# Altium integrated library SpaceVNX.IntLib: 113 symbols (part 1 of 3) (continued)
## ERJ2RKF1623X
designator R?, comment 162 kΩ
General Purpose Thick Film Chip Resistors; Manufacturer: Panasonic; Power (0402): 0.1 W; Limiting Voltage (0402): 50; Maximum Voltage (0402): 100; Resistance Range (Ω): 1Ω to 100MΩ; AEC 200: Grade 0; Size (0402): 2GE; ComponentLink1Description: Catalog; ComponentLink1URL: https://industrial.panasonic.com/ww/products/pt/general-purpose-chip-resistors/models?op=search&model_status_current=1&page=0#model-list-search-results; Series: ERJ; Temperature Range (ºC): -55 to +155; Supplier 1: Mouser; Supplier Part Number 1: 667-ERJ-2RKF1623X
footprint PANASONIC_ERJ2G_0402 (Chip Resistor, 2-Leads, Body 1,00x0,50mm, IPC Medium Density)
pins: 1, 2

## ERJ2RKF1802X
designator R?, comment 18 kΩ
General Purpose Thick Film Chip Resistors; Manufacturer: Panasonic; Power (0402): 0.1 W; Limiting Voltage (0402): 50; Maximum Voltage (0402): 100; Resistance Range (Ω): 1Ω to 100MΩ; AEC 200: Grade 0; Size (0402): 2GE; ComponentLink1Description: Catalog; ComponentLink1URL: https://industrial.panasonic.com/ww/products/pt/general-purpose-chip-resistors/models?op=search&model_status_current=1&page=0#model-list-search-results; Series: ERJ; Temperature Range (ºC): -55 to +155; Supplier 1: Digi-Key; Supplier 2: Mouser; Supplier Part Number 1: P18.0KLCT-ND; Supplier Part Number 2: 667-ERJ-2RKF1802X
footprint PANASONIC_ERJ2G_0402 (Chip Resistor, 2-Leads, Body 1,00x0,50mm, IPC Medium Density)
pins: 1, 2

## ERJ2RKF1822X
designator R?, comment 18.2 kΩ
General Purpose Thick Film Chip Resistors; Manufacturer: Panasonic; Power (0402): 0.1 W; Limiting Voltage (0402): 50; Maximum Voltage (0402): 100; Resistance Range (Ω): 1Ω to 100MΩ; AEC 200: Grade 0; Size (0402): 2GE; ComponentLink1Description: Catalog; ComponentLink1URL: https://industrial.panasonic.com/ww/products/pt/general-purpose-chip-resistors/models?op=search&model_status_current=1&page=0#model-list-search-results; Series: ERJ; Temperature Range (ºC): -55 to +155; Supplier 1: Mouser; Supplier Part Number 1: 667-ERJ-2RKF1822X
footprint PANASONIC_ERJ2G_0402 (Chip Resistor, 2-Leads, Body 1,00x0,50mm, IPC Medium Density)
pins: 1, 2

## ERJ2RKF2002X
designator R?, comment 20 kΩ
General Purpose Thick Film Chip Resistors; Manufacturer: Panasonic; Power (0402): 0.1 W; Limiting Voltage (0402): 50; Maximum Voltage (0402): 100; Resistance Range (Ω): 1Ω to 100MΩ; AEC 200: Grade 0; Size (0402): 2GE; ComponentLink1Description: Catalog; ComponentLink1URL: https://industrial.panasonic.com/ww/products/pt/general-purpose-chip-resistors/models?op=search&model_status_current=1&page=0#model-list-search-results; Series: ERJ; Temperature Range (ºC): -55 to +155; Supplier 1: Digi-Key; Supplier Part Number 1: P20.0KLCT-ND
footprint PANASONIC_ERJ2G_0402 (Chip Resistor, 2-Leads, Body 1,00x0,50mm, IPC Medium Density)
pins: 1, 2

## ERJ2RKF2003X
designator R?, comment 200 kΩ
General Purpose Thick Film Chip Resistors; Manufacturer: Panasonic; Power (0402): 0.1 W; Limiting Voltage (0402): 50; Maximum Voltage (0402): 100; Resistance Range (Ω): 1Ω to 100MΩ; AEC 200: Grade 0; Size (0402): 2GE; ComponentLink1Description: Catalog; ComponentLink1URL: https://industrial.panasonic.com/ww/products/pt/general-purpose-chip-resistors/models?op=search&model_status_current=1&page=0#model-list-search-results; Series: ERJ; Temperature Range (ºC): -55 to +155; Supplier 1: Digi-Key; Supplier Part Number 1: P200KLCT-ND
footprint PANASONIC_ERJ2G_0402 (Chip Resistor, 2-Leads, Body 1,00x0,50mm, IPC Medium Density)
pins: 1, 2

## ERJ2RKF2202X
designator R?, comment 22 kΩ
General Purpose Thick Film Chip Resistors; Manufacturer: Panasonic; Power (0402): 0.1 W; Limiting Voltage (0402): 50; Maximum Voltage (0402): 100; Resistance Range (Ω): 1Ω to 100MΩ; AEC 200: Grade 0; Size (0402): 2GE; ComponentLink1Description: Catalog; ComponentLink1URL: https://industrial.panasonic.com/ww/products/pt/general-purpose-chip-resistors/models?op=search&model_status_current=1&page=0#model-list-search-results; Series: ERJ; Temperature Range (ºC): -55 to +155; Supplier 1: Digi-Key; Supplier 2: Digi-Key; Supplier Part Number 2: P22.0KLDKR-ND; Supplier Part Number 1: P22.0KLCT-ND
footprint PANASONIC_ERJ2G_0402 (Chip Resistor, 2-Leads, Body 1,00x0,50mm, IPC Medium Density)
pins: 1, 2

## ERJ2RKF2672X
designator R?, comment 26.7 kΩ
General Purpose Thick Film Chip Resistors; Manufacturer: Panasonic; Power (0402): 0.1 W; Limiting Voltage (0402): 50; Maximum Voltage (0402): 100; Resistance Range (Ω): 1Ω to 100MΩ; AEC 200: Grade 0; Size (0402): 2GE; ComponentLink1Description: Catalog; ComponentLink1URL: https://industrial.panasonic.com/ww/products/pt/general-purpose-chip-resistors/models?op=search&model_status_current=1&page=0#model-list-search-results; Series: ERJ; Temperature Range (ºC): -55 to +155; Supplier 1: Digi-Key; Supplier Part Number 1: P26.7KLCT-ND
footprint PANASONIC_ERJ2G_0402 (Chip Resistor, 2-Leads, Body 1,00x0,50mm, IPC Medium Density)
pins: 1, 2

## ERJ2RKF3002X
designator R?, comment 30 kΩ
General Purpose Thick Film Chip Resistors; Manufacturer: Panasonic; Power (0402): 0.1 W; Limiting Voltage (0402): 50; Maximum Voltage (0402): 100; Resistance Range (Ω): 1Ω to 100MΩ; AEC 200: Grade 0; Size (0402): 2GE; ComponentLink1Description: Catalog; ComponentLink1URL: https://industrial.panasonic.com/ww/products/pt/general-purpose-chip-resistors/models?op=search&model_status_current=1&page=0#model-list-search-results; Series: ERJ; Temperature Range (ºC): -55 to +155; Supplier 1: Digi-Key; Supplier Part Number 1: P30.0KLCT-ND
footprint PANASONIC_ERJ2G_0402 (Chip Resistor, 2-Leads, Body 1,00x0,50mm, IPC Medium Density)
pins: 1, 2

## ERJ2RKF3301X
designator R?, comment 3.3 kΩ
General Purpose Thick Film Chip Resistors; Manufacturer: Panasonic; Power (0402): 0.1 W; Limiting Voltage (0402): 50; Maximum Voltage (0402): 100; Resistance Range (Ω): 1Ω to 100MΩ; AEC 200: Grade 0; Size (0402): 2GE; ComponentLink1Description: Catalog; ComponentLink1URL: https://industrial.panasonic.com/ww/products/pt/general-purpose-chip-resistors/models?op=search&model_status_current=1&page=0#model-list-search-results; Series: ERJ; Temperature Range (ºC): -55 to +155; Supplier 1: RSComponents; Supplier 2: Digi-Key; Supplier 3: Mouser; Supplier Part Number 1: 7325448; Supplier Part Number 2: P3.30KLCT-ND; Supplier Part Number 3: 667-ERJ-2RKF3301X
footprint PANASONIC_ERJ2G_0402 (Chip Resistor, 2-Leads, Body 1,00x0,50mm, IPC Medium Density)
pins: 1, 2

## ERJ2RKF3403X
designator R?, comment 340 kΩ
General Purpose Thick Film Chip Resistors; Manufacturer: Panasonic; Power (0402): 0.1 W; Limiting Voltage (0402): 50; Maximum Voltage (0402): 100; Resistance Range (Ω): 1Ω to 100MΩ; AEC 200: Grade 0; Size (0402): 2GE; ComponentLink1Description: Catalog; ComponentLink1URL: https://industrial.panasonic.com/ww/products/pt/general-purpose-chip-resistors/models?op=search&model_status_current=1&page=0#model-list-search-results; Series: ERJ; Temperature Range (ºC): -55 to +155; Supplier 1: Digi-Key; Supplier Part Number 1: P340KLCT-ND
footprint PANASONIC_ERJ2G_0402 (Chip Resistor, 2-Leads, Body 1,00x0,50mm, IPC Medium Density)
pins: 1, 2

## ERJ2RKF4021X
designator R?, comment 4 kΩ
General Purpose Thick Film Chip Resistors; Manufacturer: Panasonic; Power (0402): 0.1 W; Limiting Voltage (0402): 50; Maximum Voltage (0402): 100; Resistance Range (Ω): 1Ω to 100MΩ; AEC 200: Grade 0; Size (0402): 2GE; ComponentLink1Description: Catalog; ComponentLink1URL: https://industrial.panasonic.com/ww/products/pt/general-purpose-chip-resistors/models?op=search&model_status_current=1&page=0#model-list-search-results; Series: ERJ; Temperature Range (ºC): -55 to +155; Supplier 1: Digi-Key; Supplier 2: Digi-Key; Supplier Part Number 2: P4.02KLDKR-ND; Supplier Part Number 1: P4.02KLCT-ND
footprint PANASONIC_ERJ2G_0402 (Chip Resistor, 2-Leads, Body 1,00x0,50mm, IPC Medium Density)
pins: 1, 2

## ERJ2RKF4022X
designator R?, comment 40.2 kΩ
General Purpose Thick Film Chip Resistors; Manufacturer: Panasonic; Power (0402): 0.1 W; Limiting Voltage (0402): 50; Maximum Voltage (0402): 100; Resistance Range (Ω): 1Ω to 100MΩ; AEC 200: Grade 0; Size (0402): 2GE; ComponentLink1Description: Catalog; ComponentLink1URL: https://industrial.panasonic.com/ww/products/pt/general-purpose-chip-resistors/models?op=search&model_status_current=1&page=0#model-list-search-results; Series: ERJ; Temperature Range (ºC): -55 to +155; Supplier 1: Digi-Key; Supplier Part Number 1: P40.2KLTR-ND
footprint PANASONIC_ERJ2G_0402 (Chip Resistor, 2-Leads, Body 1,00x0,50mm, IPC Medium Density)
pins: 1, 2

## ERJ2RKF4221X
designator R?, comment 4.22 kΩ
General Purpose Thick Film Chip Resistors; Manufacturer: Panasonic; Power (0402): 0.1 W; Limiting Voltage (0402): 50; Maximum Voltage (0402): 100; Resistance Range (Ω): 1Ω to 100MΩ; AEC 200: Grade 0; Size (0402): 2GE; ComponentLink1Description: Catalog; ComponentLink1URL: https://industrial.panasonic.com/ww/products/pt/general-purpose-chip-resistors/models?op=search&model_status_current=1&page=0#model-list-search-results; Series: ERJ; Temperature Range (ºC): -55 to +155; Supplier 1: Digi-Key; Supplier 2: Mouser; Supplier Part Number 1: P4.22KLCT-ND; Supplier Part Number 2: 667-ERJ-2RKF4221X
footprint PANASONIC_ERJ2G_0402 (Chip Resistor, 2-Leads, Body 1,00x0,50mm, IPC Medium Density)
pins: 1, 2

## ERJ2RKF4703X
designator R?, comment 470 kΩ
General Purpose Thick Film Chip Resistors; Manufacturer: Panasonic; Power (0402): 0.1 W; Limiting Voltage (0402): 50; Maximum Voltage (0402): 100; Resistance Range (Ω): 1Ω to 100MΩ; AEC 200: Grade 0; Size (0402): 2GE; ComponentLink1Description: Catalog; ComponentLink1URL: https://industrial.panasonic.com/ww/products/pt/general-purpose-chip-resistors/models?op=search&model_status_current=1&page=0#model-list-search-results; Series: ERJ; Temperature Range (ºC): -55 to +155; Supplier 1: Digi-Key; Supplier Part Number 1: P470KLCT-ND
footprint PANASONIC_ERJ2G_0402 (Chip Resistor, 2-Leads, Body 1,00x0,50mm, IPC Medium Density)
pins: 1, 2

## ERJ2RKF4751X
designator R?, comment 4.75 kΩ
General Purpose Thick Film Chip Resistors; Manufacturer: Panasonic; Power (0402): 0.1 W; Limiting Voltage (0402): 50; Maximum Voltage (0402): 100; Resistance Range (Ω): 1Ω to 100MΩ; AEC 200: Grade 0; Size (0402): 2GE; ComponentLink1Description: Catalog; ComponentLink1URL: https://industrial.panasonic.com/ww/products/pt/general-purpose-chip-resistors/models?op=search&model_status_current=1&page=0#model-list-search-results; Series: ERJ; Temperature Range (ºC): -55 to +155; Supplier 1: RSComponents; Supplier 2: Digi-Key; Supplier Part Number 1: 1065277; Supplier Part Number 2: P4.75KLCT-ND
footprint PANASONIC_ERJ2G_0402 (Chip Resistor, 2-Leads, Body 1,00x0,50mm, IPC Medium Density)
pins: 1, 2

## ERJ2RKF4991X
designator R?, comment 4.99 kΩ
General Purpose Thick Film Chip Resistors; Manufacturer: Panasonic; Power (0402): 0.1 W; Limiting Voltage (0402): 50; Maximum Voltage (0402): 100; Resistance Range (Ω): 1Ω to 100MΩ; AEC 200: Grade 0; Size (0402): 2GE; ComponentLink1Description: Catalog; ComponentLink1URL: https://industrial.panasonic.com/ww/products/pt/general-purpose-chip-resistors/models?op=search&model_status_current=1&page=0#model-list-search-results; Series: ERJ; Temperature Range (ºC): -55 to +155; Supplier 1: Digi-Key; Supplier Part Number 1: P4.99KLTR-ND
footprint PANASONIC_ERJ2G_0402 (Chip Resistor, 2-Leads, Body 1,00x0,50mm, IPC Medium Density)
pins: 1, 2

## ERJ2RKF6042X
designator R?, comment 60.4 kΩ
General Purpose Thick Film Chip Resistors; Manufacturer: Panasonic; Power (0402): 0.1 W; Limiting Voltage (0402): 50; Maximum Voltage (0402): 100; Resistance Range (Ω): 1Ω to 100MΩ; AEC 200: Grade 0; Size (0402): 2GE; ComponentLink1Description: Catalog; ComponentLink1URL: https://industrial.panasonic.com/ww/products/pt/general-purpose-chip-resistors/models?op=search&model_status_current=1&page=0#model-list-search-results; Series: ERJ; Temperature Range (ºC): -55 to +155; Supplier 1: Mouser; Supplier 2: Digi-Key; Supplier Part Number 1: 667-ERJ-2RKF6042X; Supplier Part Number 2: P60.4KLCT-ND
footprint PANASONIC_ERJ2G_0402 (Chip Resistor, 2-Leads, Body 1,00x0,50mm, IPC Medium Density)
pins: 1, 2

## ERJ2RKF7500X
designator R?, comment 750 Ω
General Purpose Thick Film Chip Resistors; Manufacturer: Panasonic; Power (0402): 0.1 W; Limiting Voltage (0402): 50; Maximum Voltage (0402): 100; Resistance Range (Ω): 1Ω to 100MΩ; AEC 200: Grade 0; Size (0402): 2GE; ComponentLink1Description: Catalog; ComponentLink1URL: https://industrial.panasonic.com/ww/products/pt/general-purpose-chip-resistors/models?op=search&model_status_current=1&page=0#model-list-search-results; Series: ERJ; Temperature Range (ºC): -55 to +155; Supplier 1: Avnet; Supplier Part Number 1: 73T6541
footprint PANASONIC_ERJ2G_0402 (Chip Resistor, 2-Leads, Body 1,00x0,50mm, IPC Medium Density)
pins: 1, 2

## ERJ2RKF7502X
designator R?, comment 75 kΩ
General Purpose Thick Film Chip Resistors; Manufacturer: Panasonic; Power (0402): 0.1 W; Limiting Voltage (0402): 50; Maximum Voltage (0402): 100; Resistance Range (Ω): 1Ω to 100MΩ; AEC 200: Grade 0; Size (0402): 2GE; ComponentLink1Description: Catalog; ComponentLink1URL: https://industrial.panasonic.com/ww/products/pt/general-purpose-chip-resistors/models?op=search&model_status_current=1&page=0#model-list-search-results; Series: ERJ; Temperature Range (ºC): -55 to +155; Supplier 1: Digi-Key; Supplier Part Number 1: P75.0KLCT-ND
footprint PANASONIC_ERJ2G_0402 (Chip Resistor, 2-Leads, Body 1,00x0,50mm, IPC Medium Density)
pins: 1, 2

## ERJ2RKF9092X
designator R?, comment 90.9 kΩ
General Purpose Thick Film Chip Resistors; Manufacturer: Panasonic; Power (0402): 0.1 W; Limiting Voltage (0402): 50; Maximum Voltage (0402): 100; Resistance Range (Ω): 1Ω to 100MΩ; AEC 200: Grade 0; Size (0402): 2GE; ComponentLink1Description: Catalog; ComponentLink1URL: https://industrial.panasonic.com/ww/products/pt/general-purpose-chip-resistors/models?op=search&model_status_current=1&page=0#model-list-search-results; Series: ERJ; Temperature Range (ºC): -55 to +155; Supplier 1: Mouser; Supplier 2: Digi-Key; Supplier Part Number 2: P90.9KLCT-ND; Supplier Part Number 1: 667-ERJ-2RKF9092X
footprint PANASONIC_ERJ2G_0402 (Chip Resistor, 2-Leads, Body 1,00x0,50mm, IPC Medium Density)
pins: 1, 2

## ESD204DQAR
designator D?  (value not drawn)
ESD204 4-Channel Low-Capacitance Surge and ESD Protection Diode; Number of channels (#): 4; IO capacitance (Typ) (pF): 0.55; Vrwm (V): 3.6; Bi-/uni-directional: Bi-Directional; IO leakage current (Max) (nA): 10; Rating: Catalog; Dynamic resistance (Typ) (Ω): 0.3; Clamping voltage (V): 11.5; Operating temperature range (C): -40ºC to 125ºC; ComponentLink1Description: Manufacturer; ComponentLink1URL: https://www.ti.com/product/ESD204; Supplier 1: Digi-Key; Supplier 2: Mouser; Supplier Part Number 1: 296-49504-1-ND; Supplier Part Number 2: 595-ESD204DQAR
footprint TEXAS_USON10 (DQA)
pins: 1 IO1 (io), 2 IO2 (io), 3 GND (power), 4 IO3 (io), 5 IO4 (io), 6 NC, 7 NC, 8 GND (power), 9 NC, 10 NC

## ETC1-1T-2TR
designator T?  (value not drawn)
1:1 Flux Coupled Balun 0.1-200MHz; Frequency Range: 100 kHz to 200 MHz; Primary Impedance: 50 Ohms; Maximum DC Current: 30 mA; Power Rating: 250 mW (1/4 W); Type: RF transformer; Package: SM-22-5; ComponentLink1Description: Manufacturer; ComponentLink1URL: https://www.macom.com/products/product-detail/ETC1-1T-2TR; Supplier 1: Mouser; Supplier 2: Digi-Key; Supplier Part Number 1: 937-ETC1-1T-2; Supplier Part Number 2: ETC1-1T-2TR-ND
footprint MA-COM_ETC1-1T-2TR
pins: 1 Secondary, 2 Secondary CT, 3 Secondary Dot, 4 Primary Dot, 5 Primary

## ETPS330MUD
designator C?
Conductive Polymer Tantalum Solid Capacitors; Rated capacitance range (µF): 330.00; Rated voltage (DC) (V): 2.50; MF: Panasonic; Package: B1S; MP: ETPS330MUD; Supplier 1: Digi-Key; Supplier Part Number 1: 10-ETPS330MUDDKR-ND
footprint PANASONIC_B1S
pins: 1, 2

## EXBU28390JX
designator R?, comment 39Ω
Chip Resistor Array; Manufacturer: Panasonic; Power: 0.063 W; Limiting Voltage (0402): 50; Maximum Voltage (0402): 100; Resistance Range (Ω): 1Ω to 100MΩ; AEC 200: Grade 0; Size: 2.0 X 1.0; ComponentLink1Description: Catalog; ComponentLink1URL: https://industrial.panasonic.com/ww/products/pt/resistor-network-array/models; Series: EXB; Temperature Range (ºC): -55 to +155; Supplier 1: Digi-Key; Supplier Part Number 1: P16171CT-ND
footprint PANASONIC_EXB_0402 (4 resistors in 2.0 mm x 1.0 mm size / 0804 inch size)
pins: 1, 2, 3, 4, 5, 6, 7, 8

## FIDUCIAL
designator FID?  (value not drawn)
PCB fiducial
footprint FID1MM/2MM-SS (Fiducial 1mm copper, 2mm soldermask, single-side)

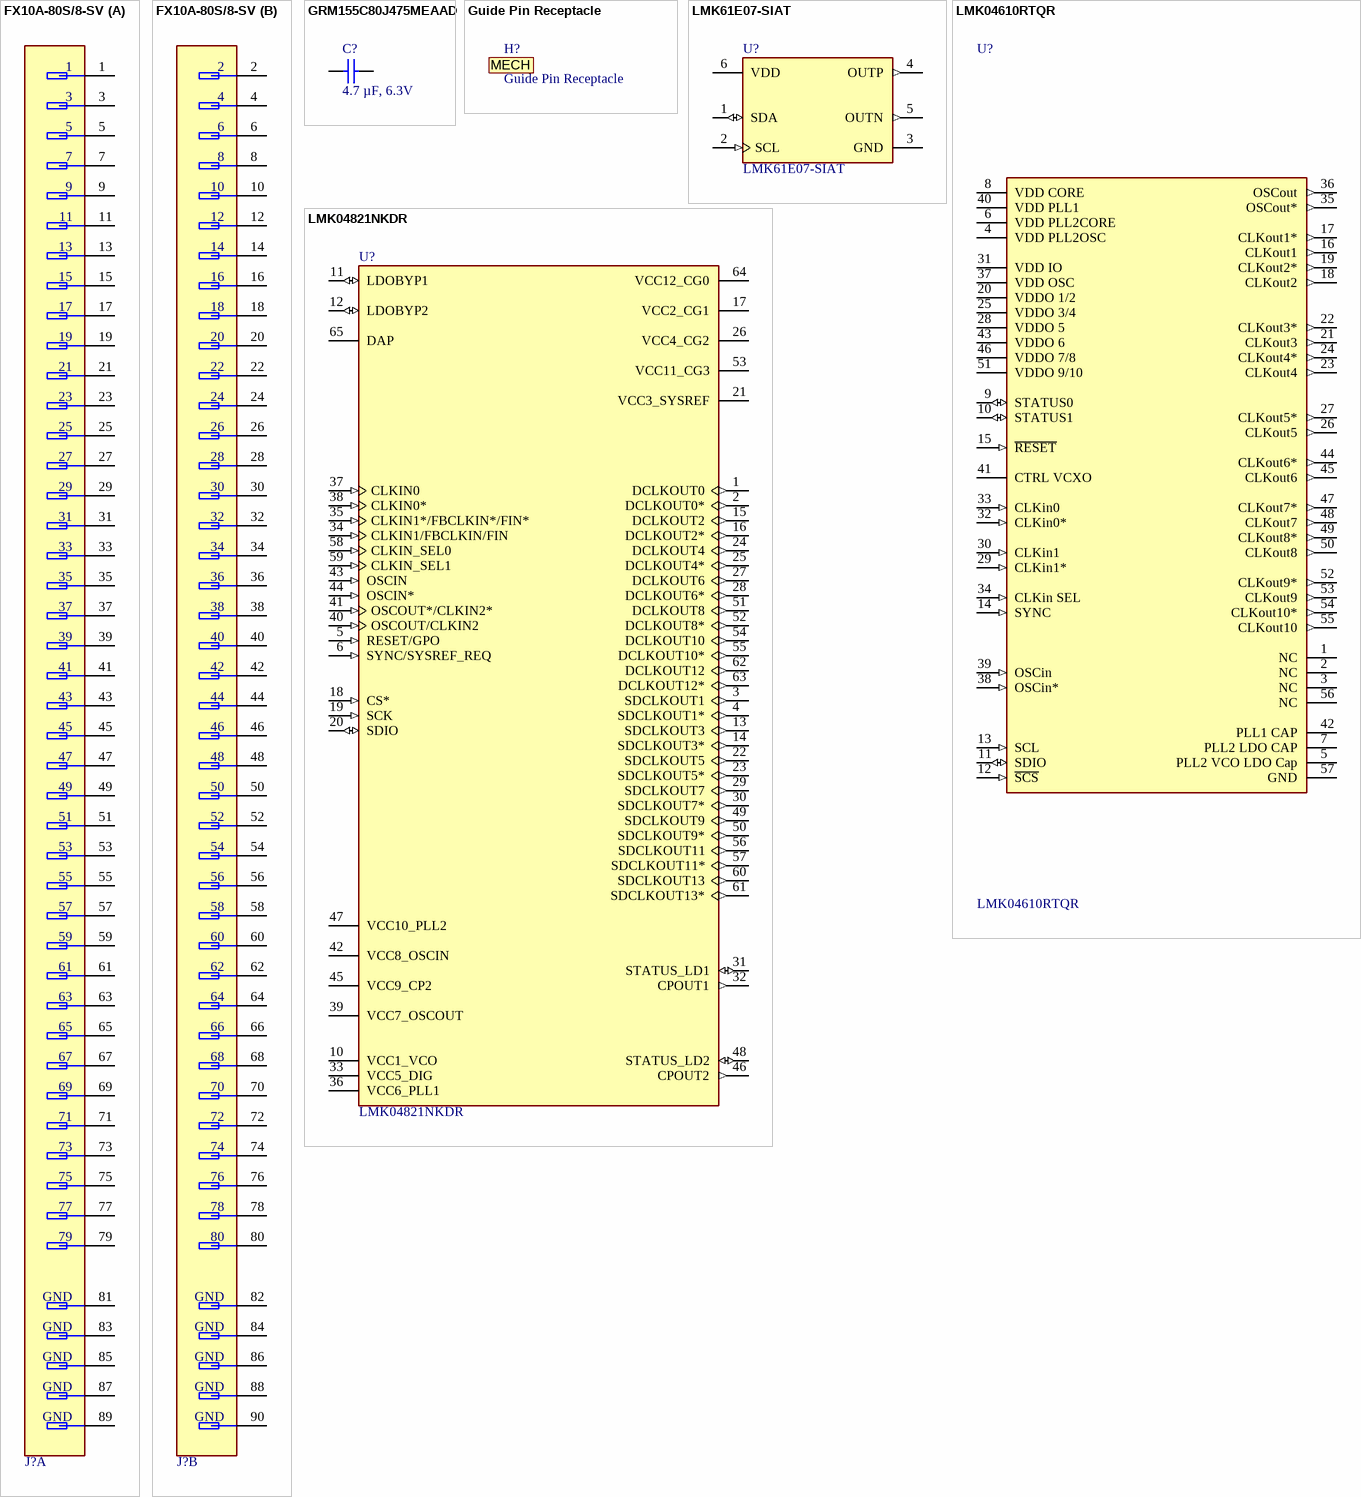
[diagram p3: symbols FX10A-80S/8-SV to LMK04821NKDR]

## FX10A-80S/8-SV
designator J?  (value not drawn)
80 Position Connector Header, Outer Shroud Contacts Surface Mount Gold; ComponentLink1Description: Manufacturer; ComponentLink1URL: https://www.hirose.com/en/product/p/CL0570-0121-7-71; Supplier 1: Digi-Key; Supplier 2: Mouser; Supplier Part Number 2: 798-FX10A80S8SV71; Supplier Part Number 1: H11232-ND
footprint HRS_FX10A-80S/8-SV (80 Position Connector Header, Outer Shroud Contacts Surface Mount Gold)
part A pins: 1, 3, 5, 7, 9, 11, 13, 15, 17, 19, 21, 23, 25, 27, 29, 31, 33, 35, 37, 39, 41, 43, 45, 47, 49, 51, 53, 55, 57, 59, 61, 63, 65, 67, 69, 71, 73, 75, 77, 79, 81 GND, 83 GND, 85 GND, 87 GND, 89 GND
part B pins: 2, 4, 6, 8, 10, 12, 14, 16, 18, 20, 22, 24, 26, 28, 30, 32, 34, 36, 38, 40, 42, 44, 46, 48, 50, 52, 54, 56, 58, 60, 62, 64, 66, 68, 70, 72, 74, 76, 78, 80, 82 GND, 84 GND, 86 GND, 88 GND, 90 GND

## GRM155C80J475MEAAD
designator C?, comment 4.7 µF, 6.3V
Multilayer Ceramic Capacitors MLCC, size 0402, X5R, 4.7 µF, 6.3V; Manufacturer Part Number: GRM155C80J475MEAAD; Manufacturer: Murata; Rated Voltage: 6.3VDC; Ceramic Type: X6S; Capacitance Tolerance: +/-20%; Dissipation Factor max.: 10%; Capacitance: 4.7 µF; Operating Temperature: -55 to +105degC; Packaging: Tape and Reel; Height: 0.5mm; Mounting Technology: SMT; Size: 0402; Supplier 1: Digi-Key; Supplier 2: Mouser; Supplier Part Number 1: 490-14458-1-ND; Supplier Part Number 2: 81-GRM155C80J475MEAD
footprint WURTH_WCAP-CSGP_0402 (Ceramic Capacitors, body 1x0.5mm)
pins: 1, 2

## Guide Pin Receptacle
designator H?  (mechanical)
Keyed Guide Right Angle Receptacle; Supplier 1: Avnet; Supplier Part Number 1: 10037912-119LF
footprint Guide Pin Receptacle
text: MECH

## LMK61E07-SIAT
designator U?
Multi-signal format, ultra-low jitter programmable oscillator with internal EEPROM; MF: Texas Instruments; Output frequency (Max) (MHz): 1000  MHz; Output level: HCSL, LVDS, LVPECL; Jitter (ps): 0.15; Stability (ppm): 25; Core supply voltage (V): 3.3; Default Frequency: 70.656 MHz; Operating temperature range (C): -40 to 85; Features: Programmable with EEPROM,Fast Mode I2C; Supplier 1: Mouser; Supplier 2: Digi-Key; Supplier Part Number 1: 595-LMK61E07-SIAT; Supplier Part Number 2: 296-51347-2-ND
footprint TEXAS_QFMSIA06 (Quad Flat Module)
pins: 1 SDA (io), 2 SCL (in), 3 GND (power), 4 OUTP (out), 5 OUTN (out), 6 VDD (power)

## LMK04610RTQR
designator U?
Ultra low-noise and low power JESD204B compliant clock jitter cleaner with dual PLLs.; Number of outputs: 10; RMS jitter (fs): 65; Output frequency (Min) (MHz): 0.03; Output frequency (Max) (MHz): 2000; Function: Dual-loop PLL; Input type: LVCMOS, LVDS, LVPECL; Output type: LVDS, LVPECL; Supply voltage (Min) (V): 1.7; Supply voltage (Max) (V): 3.465; ComponentLink1Description: Manufacturer; ComponentLink1URL: https://www.ti.com/product/LMK04828; ComponentLink2Description: Datasheet; ComponentLink2URL: https://www.ti.com/lit/ds/symlink/lmk04828.pdf?ts=1643235840450&ref_url=https%253A%252F%252Fwww.ti.com%252Fproduct%252FLMK04828; ComponentLink3Description: Package Specification; ComponentLink3URL: https://www.ti.com/lit/ml/mpqs032a/mpqs032a.pdf?ts=1643290177634&ref_url=https%253A%252F%252Fwww.ti.com%252Fpackaging%252Fdocs%252Fsearchproductbypackage.tsp%253ForderablePartNumber%253D%2526packageDesignator%253DNKD%2526pinCount%253D64%2526results%253Dresults; Operating temperature range (ºC): -40ºC to 85ºC; Supplier 1: Digi-Key; Supplier 2: Digi-Key; Supplier Part Number 1: 296-51339-1-ND; Supplier Part Number 2: 296-51339-6-ND
footprint TEXAS_VQFN56 (RTQ, 0.5mm pitch, 8x8mm body)
pins: 1 NC, 2 NC, 3 NC, 4 VDD PLL2OSC (power), 5 PLL2 VCO LDO Cap (power), 6 VDD PLL2CORE (power), 7 PLL2 LDO CAP (power), 8 VDD CORE (power), 9 STATUS0 (io), 10 STATUS1 (io), 11 SDIO (io), 12 ~{SCS} (in), 13 SCL (in), 14 SYNC (in), 15 ~{RESET} (in), 16 CLKout1 (out), 17 CLKout1* (out), 18 CLKout2 (out), 19 CLKout2* (out), 20 VDDO 1/2 (power), 21 CLKout3 (out), 22 CLKout3* (out), 23 CLKout4 (out), 24 CLKout4* (out), 25 VDDO 3/4 (power), 26 CLKout5 (out), 27 CLKout5* (out), 28 VDDO 5 (power), 29 CLKin1* (in), 30 CLKin1 (in), 31 VDD IO (power), 32 CLKin0* (in), 33 CLKin0 (in), 34 CLKin SEL (in), 35 OSCout* (out), 36 OSCout (out), 37 VDD OSC (power), 38 OSCin* (in), 39 OSCin (in), 40 VDD PLL1 (power), 41 CTRL VCXO (power), 42 PLL1 CAP, 43 VDDO 6 (power), 44 CLKout6* (out), 45 CLKout6 (out), 46 VDDO 7/8 (power), 47 CLKout7* (out), 48 CLKout7 (out), 49 CLKout8* (out), 50 CLKout8 (out), 51 VDDO 9/10 (power), 52 CLKout9* (out), 53 CLKout9 (out), 54 CLKout10* (out), 55 CLKout10 (out), 56 NC, 57 GND (power)

## LMK04821NKDR
designator U?
Ultra low-noise JESD204B compliant clock jitter cleaner with integrated 2370 to 2630-MHz VCO.; Number of outputs: 15; RMS jitter (fs): 88; Output frequency (Min) (MHz): 0.289; Output frequency (Max) (MHz): 3080; Function: Dual-loop PLL; Input type: LVCMOS, LVDS, LVPECL; Supply voltage (Min) (V): 3.15; Supply voltage (Max) (V): 3.45; ComponentLink1Description: Manufacturer; ComponentLink1URL: https://www.ti.com/product/LMK04828; ComponentLink2Description: Datasheet; ComponentLink2URL: https://www.ti.com/lit/ds/symlink/lmk04828.pdf?ts=1643235840450&ref_url=https%253A%252F%252Fwww.ti.com%252Fproduct%252FLMK04828; ComponentLink3Description: Package Specification; ComponentLink3URL: https://www.ti.com/lit/ml/mpqs032a/mpqs032a.pdf?ts=1643290177634&ref_url=https%253A%252F%252Fwww.ti.com%252Fpackaging%252Fdocs%252Fsearchproductbypackage.tsp%253ForderablePartNumber%253D%2526packageDesignator%253DNKD%2526pinCount%253D64%2526results%253Dresults; Output type: LVCMOS, LVDS, LVPECL; Operating temperature range (ºC): -40ºC to 85ºC; Supplier 1: Digi-Key; Supplier Part Number 1: LMK04821NKDR-ND
footprint TEXAS_WQFN64
pins: 1 DCLKOUT0 (out), 2 DCLKOUT0* (out), 3 SDCLKOUT1 (out), 4 SDCLKOUT1* (out), 5 RESET/GPO (in), 6 SYNC/SYSREF_REQ (in), 10 VCC1_VCO (power), 11 LDOBYP1 (io), 12 LDOBYP2 (io), 13 SDCLKOUT3 (out), 14 SDCLKOUT3* (out), 15 DCLKOUT2 (out), 16 DCLKOUT2* (out), 17 VCC2_CG1 (power), 18 CS* (in), 19 SCK (in), 20 SDIO (io), 21 VCC3_SYSREF (power), 22 SDCLKOUT5 (out), 23 SDCLKOUT5* (out), 24 DCLKOUT4 (out), 25 DCLKOUT4* (out), 26 VCC4_CG2 (power), 27 DCLKOUT6 (out), 28 DCLKOUT6* (out), 29 SDCLKOUT7 (out), 30 SDCLKOUT7* (out), 31 STATUS_LD1 (io), 32 CPOUT1 (out), 33 VCC5_DIG (power), 34 CLKIN1/FBCLKIN/FIN (in), 35 CLKIN1*/FBCLKIN*/FIN* (in), 36 VCC6_PLL1 (power), 37 CLKIN0 (in), 38 CLKIN0* (in), 39 VCC7_OSCOUT (power), 40 OSCOUT/CLKIN2 (in), 41 OSCOUT*/CLKIN2* (in), 42 VCC8_OSCIN (power), 43 OSCIN (in), 44 OSCIN* (in), 45 VCC9_CP2 (power), 46 CPOUT2 (out), 47 VCC10_PLL2 (power), 48 STATUS_LD2 (io), 49 SDCLKOUT9 (out), 50 SDCLKOUT9* (out), 51 DCLKOUT8 (out), 52 DCLKOUT8* (out), 53 VCC11_CG3 (power), 54 DCLKOUT10 (out), 55 DCLKOUT10* (out), 56 SDCLKOUT11 (out), 57 SDCLKOUT11* (out), 58 CLKIN_SEL0 (in), 59 CLKIN_SEL1 (in), 60 SDCLKOUT13 (out), 61 SDCLKOUT13* (out), 62 DCLKOUT12 (out), 63 DCLKOUT12* (out), 64 VCC12_CG0 (power), 65 DAP (power)

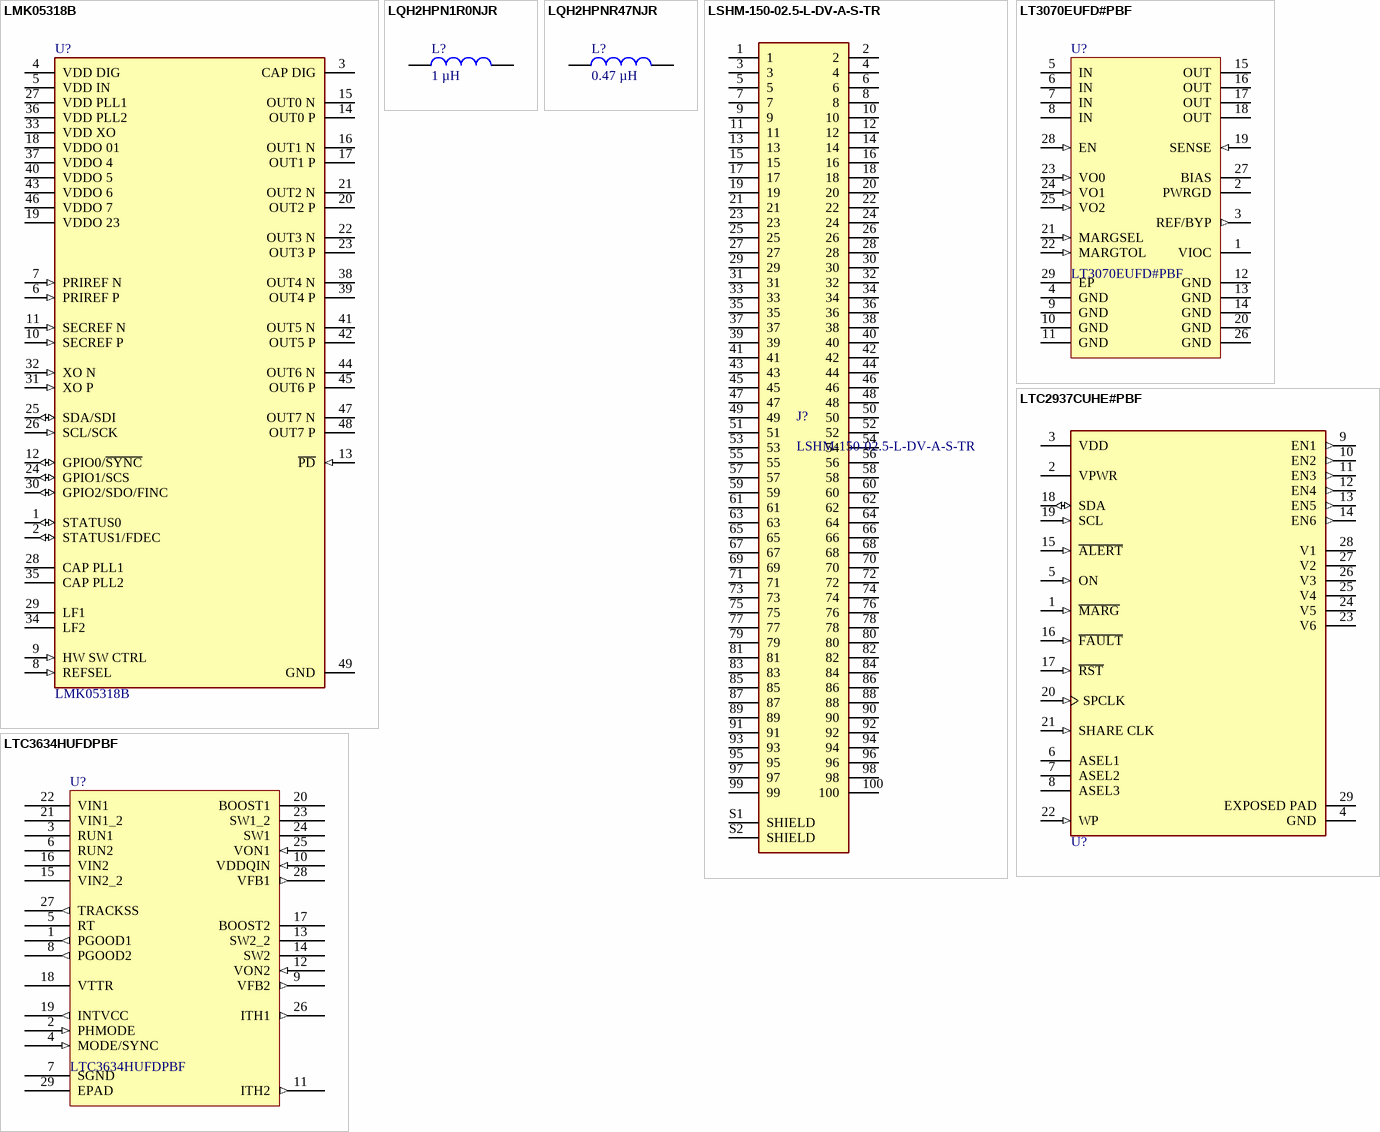
[diagram p4: symbols LMK05318B to LTC3634HUFDPBF]

## LMK05318B
designator U?
Ultra-low jitter single channel network synchronizer clock with BAW; Input type: LVCMOS, LVDS, LVPECL, XTAL; Output type: LVDS, CML, LVPECL, HCSL, LVCMOS; Output frequency (Min) (MHz): 0.000001; Output frequency (Max) (MHz): 800; Supply voltage (Min) (V): 3.135; Supply voltage (Max) (V): 3.465; RMS jitter (fs): 50; Number of outputs: 8; Function: Clock network synchronizer; Operating temperature range (C): -40 to 85; Package: VQFN48; Supplier 1: Digi-Key; Supplier 2: Mouser; Supplier Part Number 1: 296-LMK05318BRGZTCT-ND; Supplier Part Number 2: 595-LMK05318BRGZT
footprint TEXAS_VQFN48 (RGZ, 0.5mm pitch, 7x7mm body)
pins: 1 STATUS0 (io), 2 STATUS1/FDEC (io), 3 CAP DIG, 4 VDD DIG (power), 5 VDD IN (power), 6 PRIREF P (in), 7 PRIREF N (in), 8 REFSEL (in), 9 HW SW CTRL (in), 10 SECREF P (in), 11 SECREF N (in), 12 GPIO0/~{SYNC} (io), 13 ~{PD} (in), 14 OUT0 P, 15 OUT0 N, 16 OUT1 N, 17 OUT1 P, 18 VDDO 01 (power), 19 VDDO 23 (power), 20 OUT2 P, 21 OUT2 N, 22 OUT3 N, 23 OUT3 P, 24 GPIO1/SCS (io), 25 SDA/SDI (io), 26 SCL/SCK (in), 27 VDD PLL1 (power), 28 CAP PLL1, 29 LF1, 30 GPIO2/SDO/FINC (io), 31 XO P (in), 32 XO N (in), 33 VDD XO (power), 34 LF2, 35 CAP PLL2, 36 VDD PLL2 (power), 37 VDDO 4 (power), 38 OUT4 N, 39 OUT4 P, 40 VDDO 5 (power), 41 OUT5 N, 42 OUT5 P, 43 VDDO 6 (power), 44 OUT6 N, 45 OUT6 P, 46 VDDO 7 (power), 47 OUT7 N, 48 OUT7 P, 49 GND (power)

## LQH2HPN1R0NJR
designator L?, comment 1 µH
Wire Wound Ferrite Inductor; Manufacturer: Murata; Inductance: 470 nH - 22 µH; AEC 200: Grade 0; Length (mm): 2.5; Width (mm): 2; ComponentLink1Description: Manufacturer; ComponentLink1URL: https://www.murata.com/search/productsearch?cate=cgInductors&partno=LQH2HPN_JR&realtime=1&sort=d_inductance; Height (mm): 1.2; Operating temperature range (C): −40°C to +125°C; Series: LQH2HPN_JR; Supplier 1: Digi-Key; Supplier 2: Mouser; Supplier Part Number 1: 490-9898-1-ND; Supplier Part Number 2: 81-LQH2HPN1R0NJRL
footprint Murata_LQH2HPN_JR (1008 (2520))
pins: 1, 2

## LQH2HPNR47NJR
designator L?, comment 0.47 µH
Wire Wound Ferrite Inductor; Manufacturer: Murata; Inductance: 470 nH - 22 µH; AEC 200: Grade 0; Length (mm): 2.5; Width (mm): 2; ComponentLink1Description: Manufacturer; ComponentLink1URL: https://www.murata.com/search/productsearch?cate=cgInductors&partno=LQH2HPN_JR&realtime=1&sort=d_inductance; Height (mm): 1.2; Operating temperature range (C): −40°C to +125°C; Series: LQH2HPN_JR; Supplier 1: Digi-Key; Supplier 2: Mouser; Supplier Part Number 1: 490-9906-1-ND; Supplier Part Number 2: 81-LQH2HPNR47NJRL
footprint Murata_LQH2HPN_JR (1008 (2520))
pins: 1, 2

## LSHM-150-02.5-L-DV-A-S-TR
designator J?
100 Position Connector Self Mating, Non-Gendered Surface Mount Gold; ComponentLink1Description: Manufacturer; ComponentLink1URL: https://www.samtec.com/products/lshm; System: Connector
footprint SAMTEC_LSHM-150-02.5-L-DV-A-S-TR (Footprint not found)
pins: 1, 2, 3, 4, 5, 6, 7, 8, 9, 10, 11, 12, 13, 14, 15, 16, 17, 18, 19, 20, 21, 22, 23, 24, 25, 26, 27, 28, 29, 30, 31, 32, 33, 34, 35, 36, 37, 38, 39, 40, 41, 42, 43, 44, 45, 46, 47, 48, 49, 50, 51, 52, 53, 54, 55, 56, 57, 58, 59, 60, 61, 62, 63, 64, 65, 66, 67, 68, 69, 70, 71, 72, 73, 74, 75, 76, 77, 78, 79, 80, 81, 82, 83, 84, 85, 86, 87, 88, 89, 90, 91, 92, 93, 94, 95, 96, 97, 98, 99, 100, S1 SHIELD, S2 SHIELD

## LT3070EUFD#PBF
designator U?
5 A, Low Noise, Programmable Output 85 mV Dropout Linear Regulator, 0.95 to 3 V Vin, Adjustable Vout, 28-pin QFN (UFD-28), -40 to 125 degC, Pb-Free; Manufacturer: Linear Technology; Iout(mA): 5000; Vin Min(V): 0.95; Number of Outputs: 1; PSRR(dB): 72; Vin Max(V): 3; Noise(uV): 25; Vout Min(V): 0.8; Dropout Voltage(V): 0.085; Discrete Pass Element: no; Output Voltage: Adj; Vout Max(V): 1.8; PartNumber: LT3070EUFD#PBF; Isupply(mA): 1; Mounting Technology: Surface Mount; PackageReference: UFD-28; PackageDescription: 28-Pin Plastic QFN, Body 5 x 4 mm, Pitch 0.5 mm; Supplier 1: Mouser; Supplier Part Number 1: 584-LT3070EUFD#PBF
footprint LTC_QFN28_UFD (28-Lead Plastic QFN (4mm × 5mm))
pins: 1 VIOC (power) "Voltage for In-to-Out Control. The IC incorporates a unique tracking function to control a buck regulator powering the LT3070’s input. The VIOC pin is the output of this tracking function that drives the buck regulator t(See Datasheet)", 2 PWRGD (oc) "Power Good. The PWRGD pin is an open-drain NMOS output that actively pulls low if any one of these fault modes is detected: • VOUT is less than 90% of VOUT(NOMINAL) on the rising edge of VOUT . • VOUT drops below 85%(See Datasheet)", 3 REF/BYP (out) "Reference Filter. The pin is the output of the bandgap reference and has an impedance of approximately 19kohm. This pin must not be externally loaded. Bypassing the REF/BYP pin to GND with a 10nF capacitor decreases output (See Datasheet)", 4 GND (power) "Ground. The exposed pad (Pin 29) of the QFN package is an electrical connection to GND. To ensure proper electrical and thermal performance, solder Pin 29 to the PCB ground and tie to all GND pins of the package. These GND (See Datasheet)", 5 IN (power) "Input Supply. These pins supply power to the high current pass transistor. Tie all IN pins together for proper performance. The LT3070 requires a bypass capacitor at IN to maintain stability and low input impedance over (See Datasheet)", 6 IN (power) "Input Supply. These pins supply power to the high current pass transistor. Tie all IN pins together for proper performance. The LT3070 requires a bypass capacitor at IN to maintain stability and low input impedance over (See Datasheet)", 7 IN (power) "Input Supply. These pins supply power to the high current pass transistor. Tie all IN pins together for proper performance. The LT3070 requires a bypass capacitor at IN to maintain stability and low input impedance over (See Datasheet)", 8 IN (power) "Input Supply. These pins supply power to the high current pass transistor. Tie all IN pins together for proper performance. The LT3070 requires a bypass capacitor at IN to maintain stability and low input impedance over (See Datasheet)", 9 GND (power) "Ground. The exposed pad (Pin 29) of the QFN package is an electrical connection to GND. To ensure proper electrical and thermal performance, solder Pin 29 to the PCB ground and tie to all GND pins of the package. These GND (See Datasheet)", 10 GND (power) "Ground. The exposed pad (Pin 29) of the QFN package is an electrical connection to GND. To ensure proper electrical and thermal performance, solder Pin 29 to the PCB ground and tie to all GND pins of the package. These GND (See Datasheet)", 11 GND (power) "Ground. The exposed pad (Pin 29) of the QFN package is an electrical connection to GND. To ensure proper electrical and thermal performance, solder Pin 29 to the PCB ground and tie to all GND pins of the package. These GND (See Datasheet)", 12 GND (power) "Ground. The exposed pad (Pin 29) of the QFN package is an electrical connection to GND. To ensure proper electrical and thermal performance, solder Pin 29 to the PCB ground and tie to all GND pins of the package. These GND (See Datasheet)", 13 GND (power) "Ground. The exposed pad (Pin 29) of the QFN package is an electrical connection to GND. To ensure proper electrical and thermal performance, solder Pin 29 to the PCB ground and tie to all GND pins of the package. These GND (See Datasheet)", 14 GND (power) "Ground. The exposed pad (Pin 29) of the QFN package is an electrical connection to GND. To ensure proper electrical and thermal performance, solder Pin 29 to the PCB ground and tie to all GND pins of the package. These GND (See Datasheet)", 15 OUT (power) "Output. These pins supply power to the load. Tie all OUT pins together for proper performance. A minimum output capacitance of 15uF is required for stability. LTC recommends low ESR, X5R or X7R dielectric ceramic capacitors (See Datasheet)", 16 OUT (power) "Output. These pins supply power to the load. Tie all OUT pins together for proper performance. A minimum output capacitance of 15uF is required for stability. LTC recommends low ESR, X5R or X7R dielectric ceramic capacitors (See Datasheet)", 17 OUT (power) "Output. These pins supply power to the load. Tie all OUT pins together for proper performance. A minimum output capacitance of 15uF is required for stability. LTC recommends low ESR, X5R or X7R dielectric ceramic capacitors (See Datasheet)", 18 OUT (power) "Output. These pins supply power to the load. Tie all OUT pins together for proper performance. A minimum output capacitance of 15uF is required for stability. LTC recommends low ESR, X5R or X7R dielectric ceramic capacitors (See Datasheet)", 19 SENSE (in) "Kelvin Sense for OUT . The SENSE pin is the inverting input to the error amplifier. Optimum regulation is obtained when the SENSE pin is connected to the OUT pins of the regulator. In critical applications, the resistance (See Datasheet)", 20 GND (power) "Ground. The exposed pad (Pin 29) of the QFN package is an electrical connection to GND. To ensure proper electrical and thermal performance, solder Pin 29 to the PCB ground and tie to all GND pins of the package. These GND (See Datasheet)", 21 MARGSEL (in) "Margining Enable and Polarity Selection. This three-state pin determines both the polarity and the active state of the margining function. The logic low threshold is less than 250mV referenced to GND and enables negative (See Datasheet)", 22 MARGTOL (in) "Margining Tolerance. This three-state pin selects the absolute value of margining (1%, 3% or 5%) if enabled by the MARGSEL input. The logic low threshold is less than 250mV referenced to GND and enables either +/-1% change (See Datasheet)", 23 VO0 (in) "Output Voltage Select. These three-state pins combine to select a nominal output voltage from 0.8V to 1.8V in increments of 50mV. Output voltage is limited to 1.8V maximum by an internal override of VO1 when VO2 = high. The (See Datasheet)", 24 VO1 (in) "Output Voltage Select. These three-state pins combine to select a nominal output voltage from 0.8V to 1.8V in increments of 50mV. Output voltage is limited to 1.8V maximum by an internal override of VO1 when VO2 = high. The (See Datasheet)", 25 VO2 (in) "Output Voltage Select. These three-state pins combine to select a nominal output voltage from 0.8V to 1.8V in increments of 50mV. Output voltage is limited to 1.8V maximum by an internal override of VO1 when VO2 = high. The (See Datasheet)", 26 GND (power) "Ground. The exposed pad (Pin 29) of the QFN package is an electrical connection to GND. To ensure proper electrical and thermal performance, solder Pin 29 to the PCB ground and tie to all GND pins of the package. These GND (See Datasheet)", 27 BIAS (power) "Bias Supply. This pin supplies current to the internal control circuitry and the output stage driving the pass transistor. The LT3070 requires a minimum 2.2uF bypass capacitor for stability and proper operation. To ensure (See Datasheet)", 28 EN (in) "Enable. This pin enables/disables the output device only. The internal reference and all support functions are active if VBIAS is above its UVLO threshold. Pulling EN low keeps the reference circuit active, but disables the (See Datasheet)", 29 EP (power) "Ground. The exposed pad (Pin 29) of the QFN package is an electrical connection to GND. To ensure proper electrical and thermal performance, solder Pin 29 to the PCB ground and tie to all GND pins of the package. These GND (See Datasheet)"

## LTC2937CUHE#PBF
designator U?  (value not drawn)
Programmable Six Channel Sequencer and Voltage Supervisor with EEPROM
footprint LTC_QFN28_UHE (28-Lead (5mm × 6mm) Plastic QFN)
pins: 1 ~{MARG} (in), 2 VPWR (power), 3 VDD (power), 4 GND (power), 5 ON (in), 6 ASEL1, 7 ASEL2, 8 ASEL3, 9 EN1 (out), 10 EN2 (out), 11 EN3 (out), 12 EN4 (out), 13 EN5 (out), 14 EN6 (out), 15 ~{ALERT} (in), 16 ~{FAULT} (in), 17 ~{RST} (in), 18 SDA (io), 19 SCL (in), 20 SPCLK (in), 21 SHARE CLK (in), 22 WP (in), 23 V6 (power), 24 V5 (power), 25 V4 (power), 26 V3 (power), 27 V2 (power), 28 V1 (power), 29 EXPOSED PAD (power)

## LTC3634HUFDPBF
designator U?
15V Dual 3A Monolithic Step-Down Regulator for DDR Power; Input Voltage Range: 3.6V to 15V; Maximun Efficiency: 95%; Switching Frequency: 500kHz to 4MHz; Output Current per Channel: ±3A; Package: UFD QFN 28; Supplier 1: Mouser; Supplier Part Number 1: 584-LTC3634EUFD#PBF
footprint LTC_QFN28_UFD (28-Lead Plastic QFN (4mm × 5mm))
pins: 1 PGOOD1 (out), 2 PHMODE (in), 3 RUN1, 4 MODE/SYNC (in), 5 RT, 6 RUN2, 7 SGND (power), 8 PGOOD2 (out), 9 VFB2 (out), 10 VDDQIN (in), 11 ITH2 (out), 12 VON2 (in), 13 SW2_2, 14 SW2, 15 VIN2_2 (power), 16 VIN2 (power), 17 BOOST2, 18 VTTR (power), 19 INTVCC (out), 20 BOOST1, 21 VIN1_2 (power), 22 VIN1 (power), 23 SW1_2, 24 SW1, 25 VON1 (in), 26 ITH1 (out), 27 TRACKSS (out), 28 VFB1 (out), 29 EPAD

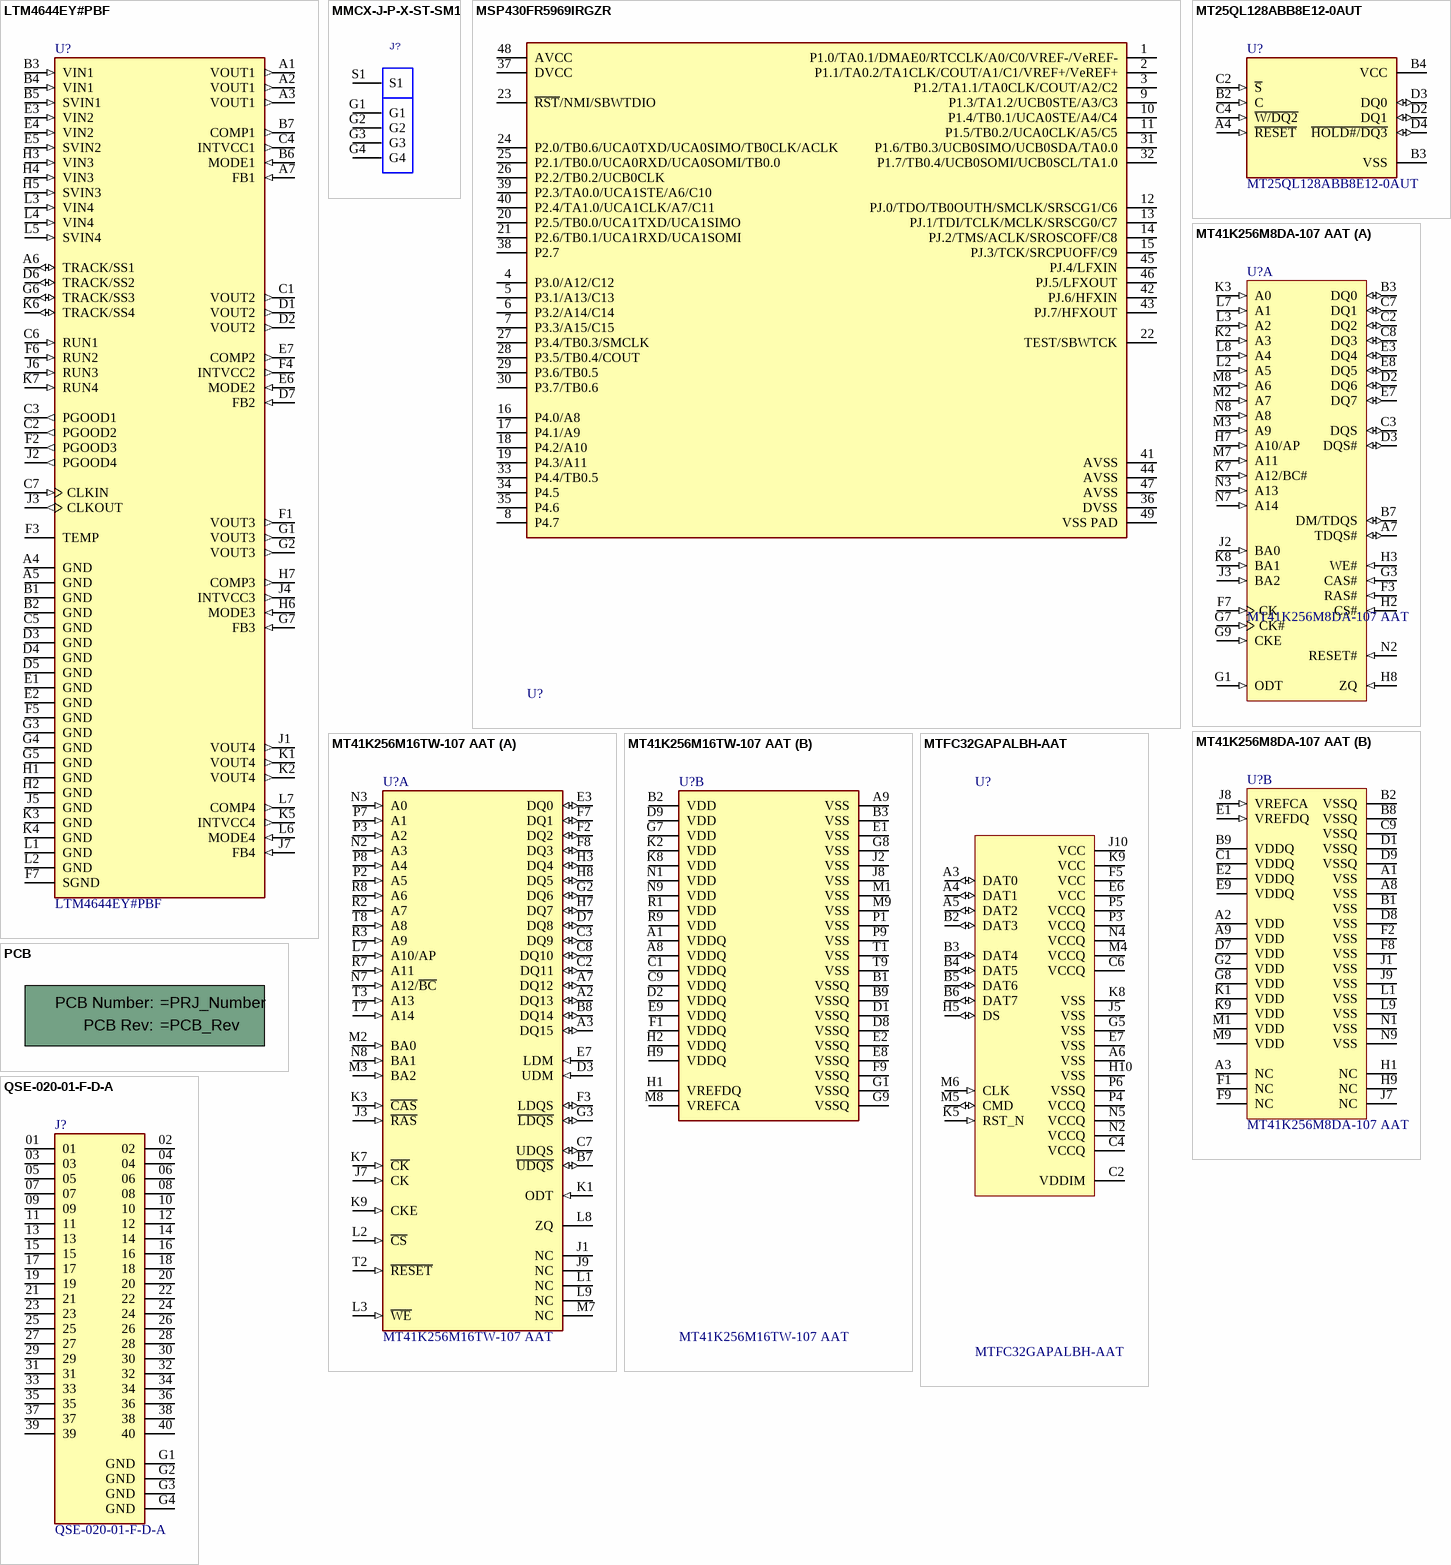
[diagram p5: symbols LTM4644EY#PBF to QSE-020-01-F-D-A]